# Altium footprint library MidFlg_V2.PcbLib: 28 footprints (part 1 of 2)
Each footprint in its own frame and in the unit in brackets; x right, y up, seen from the top. Pads: shape width x height; smd on the part's side, far side on the other; paste and mask are expansions set on the pad; w line width, h text height; cw(c..) or ccw(c..) is an arc to the next point about the centre after c.
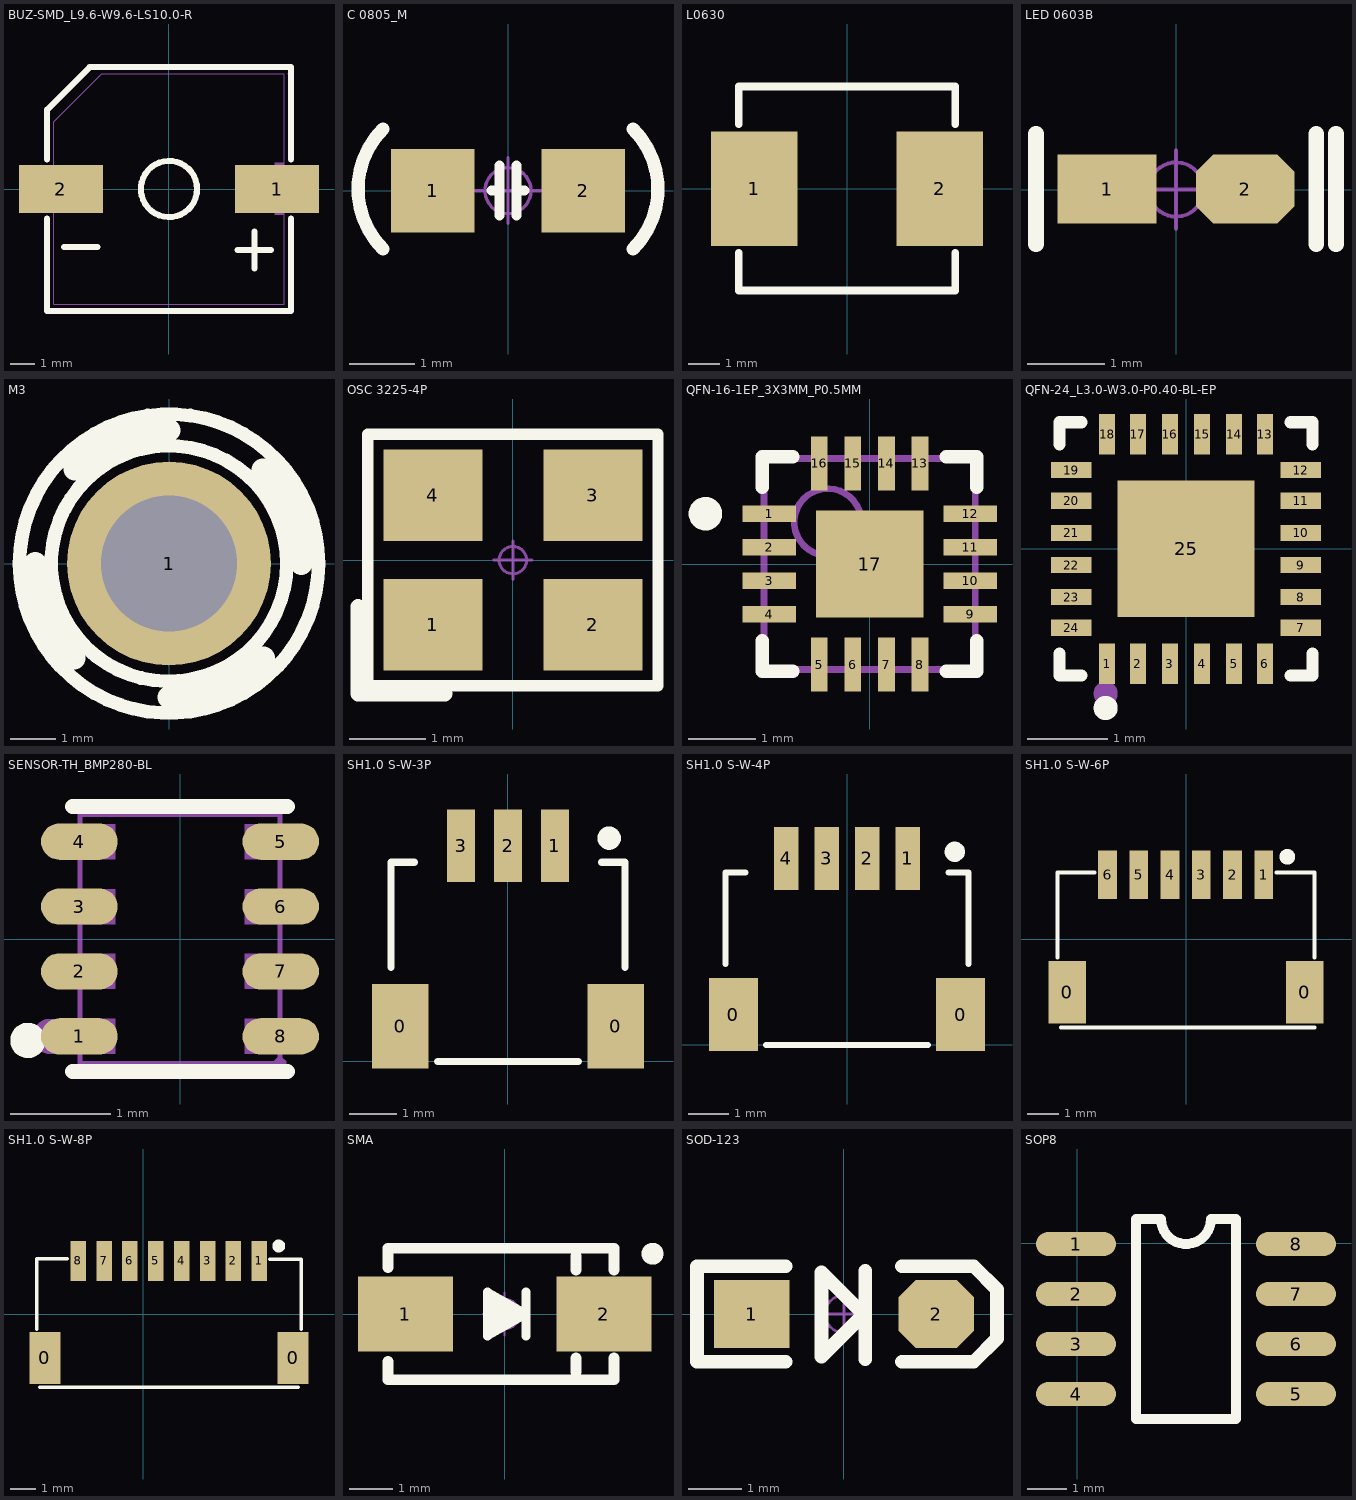
[diagram p0: the footprints below, top view; thin cyan lines are the x and y axes]

## BUZ-SMD_L9.6-W9.6-LS10.0-R [mm]
pads (2):
  rect 3.5x2 smd mask+0.051: 1(4.5,0) 2(-4.5,0)
Top Overlay:
  circle w0.254: c0.001,0 r1.171
  lines w0.254: -5.079,-1.232 -5.079,-5.08 5.081,-5.08 5.081,-1.231 ; -5.079,1.232 -5.079,3.302 -3.301,5.08 5.081,5.08 5.081,1.231 ; -4.381,-2.413 -2.984,-2.413 ; 2.858,-2.54 4.255,-2.54 ; 3.557,-3.302 3.557,-1.778
Mechanical 6:
  region: 3.493,0.191 5.652,0.191 5.652,-0.191 3.493,-0.191
  region: 4.41,-1.07 4.41,1.089 4.791,1.089 4.791,-1.07
  region: -5.508,0.191 -3.349,0.191 -3.349,-0.191 -5.508,-0.191
Mechanical 15:
  region: 5.06,4.8 5.06,4.825 5.025,4.86 4.975,4.86 4.94,4.825 4.94,4.8 4.94,4.775 4.975,4.74 5.025,4.74 5.06,4.775 5.06,4.8
  region: 3.3,0.75 5,0.75 5,-0.75 3.3,-0.75
  region: -3.3,-0.75 -5,-0.75 -5,0.75 -3.3,0.75
  lines w0.051: -4.8,-4.8 4.8,-4.8 4.8,4.8 -2.8,4.8 -4.8,2.8 -4.8,-4.8
3D body "BUZZER1.STEP": height 4.95, standoff 0, extent -5,-4.8 5,4.8

## C 0805_M [mil] "无极性贴片电容                                         淘宝ID:黄晶宝石"
height 19.68
pads (2):
  rect 50x50 smd: 1(-45,0) 2(45,0)
Top Overlay:
  lines w6: -10,0 -5,0 ; -5,-15 -5,15 ; 5,-15 5,15 ; 5,0 10,0
  lines w7.87: -75,-35 cw(c-39,1) -75,37 ; 75,-35 ccw(c39,1) 75,37
Mechanical 15:
  circle w1.97: c0,0 r13.78
  lines w1.97: -19.68,0 19.68,0 ; 0,-19.68 0,19.68
3D body "C 0805.STEP": height 20.08, standoff -0.39, extent -39.37,-24.02 39.37,24.02

## L0630 [mm]
pads (2):
  rect 2.8x3.7 smd: 1(-3,0) 2(3,0)
Top Overlay:
  lines w0.254: -3.5,-2.081 -3.5,-3.3 -3.49,-3.3 3.5,-3.3 3.5,-2.081 ; -3.5,2.081 -3.5,3.3 3.48,3.3 3.5,3.28 ; 3.5,2.081 3.5,3.3
Mechanical 5:
  region: 1.9,1.5 3.5,1.5 3.5,-1.5 1.9,-1.5
  region: -1.9,-1.5 -3.5,-1.5 -3.5,1.5 -1.9,1.5
Mechanical 6:
  circle w0.06: c-3.5,-3.3 r0.03
3D body "User Library-L0630.STEP": height 3.18, standoff 0.03, extent -3.5,-3 3.5,3

## LED 0603B [mil] "蓝色0603LED                             淘宝ID:黄晶宝石"
pads (2):
  rect 50x35 smd: 1(-35,0.26)
  oct 50x35 smd: 2(35,0.26)
Top Overlay:
  lines w8: -71,-27.74 -71,-25.74 -71,28.26 ; 71,-27.74 71,28.26 ; 81,-27.74 81,28.26
Mechanical 15:
  circle w1.97: c0,0 r13.78
  lines w1.97: -19.68,0 19.68,0 ; 0,-19.68 0,19.68
3D body "LED 0603玻璃罩.STEP": height 23.82, standoff 8.07, extent -23.58,-15.79 23.58,15.79
3D body "LED 0603-B.STEP": height 18.36, standoff -0.16, extent -31.49,-15.79 31.5,15.79

## M3 [mm]
pads (1):
  round 4.5 hole 3: 1(0,0)
Top Overlay:
  circle w0.3: c0,0 r3.3
  circle w0.3: c0,0 r2.6
  lines w0.5: -2.952,0 ccw(c0,0) -2.088,-2.088 ; -2.081,2.081 cw(c0,0) 0,2.943 ; 0,-2.95 ccw(c0,0) 2.086,-2.086 ; 2.066,2.066 cw(c0,0) 2.922,0
Bottom Overlay:
  circle w0.3: c0,-0.02 r2.6
  circle w0.3: c0,-0.02 r3.3
  lines w0.5: -2.952,-0.02 ccw(c0,-0.02) -2.088,-2.108 ; -2.081,2.061 cw(c0,-0.02) 0,2.923 ; 0,-2.97 ccw(c0,-0.02) 2.086,-2.106 ; 2.066,2.046 cw(c0,-0.02) 2.922,-0.02

## OSC 3225-4P [mm] "3.2*2.5*0.7mm(长宽高)                         淘宝ID:黄晶宝石"
pads (4):
  rect 1.3x1.2 smd: 1(-1.05,-0.85) 2(1.05,-0.85) 3(1.05,0.85) 4(-1.05,0.85)
Top Overlay:
  lines w0.15: -1.905,-1.651 1.905,-1.651 1.905,1.651 -1.905,1.651 -1.905,-1.651
  lines w0.2: -2.032,-1.753 -0.889,-1.753 ; -2.032,-1.727 -2.032,-0.61
Mechanical 15:
  circle w0.04: c0,0 r0.18
  lines w0.04: -0.254,0 0.254,0 ; 0,-0.254 0,0.254
3D body "OSC 3225-4.STEP": height 0.7, standoff -0.02, extent -1.6,-1.25 1.6,1.25

## QFN-16-1EP_3X3MM_P0.5MM [mm] "QFN, 16-Leads, Body 3.2x3.2mm (max), Pitch 0.50mm, IPC Medium Density"
height 1
pads (17):
  rect 0.8x0.25 smd: 1(-1.5,0.75) 2(-1.5,0.25) 3(-1.5,-0.25) 4(-1.5,-0.75) 9(1.5,-0.75) 10(1.5,-0.25) 11(1.5,0.25) 12(1.5,0.75)
  rect 0.25x0.8 smd: 5(-0.75,-1.5) 6(-0.25,-1.5) 7(0.25,-1.5) 8(0.75,-1.5) 13(0.75,1.5) 14(0.25,1.5) 15(-0.25,1.5) 16(-0.75,1.5)
  rect 1.6x1.6 smd: 17(0,0)
Top Overlay:
  circle w0.25: c-2.45,0.75 r0.125
  lines w0.2: -1.6,-1.143 -1.6,-1.6 -1.143,-1.6 ; -1.6,1.143 -1.6,1.6 -1.143,1.6 ; 1.143,-1.6 1.6,-1.6 1.6,-1.143 ; 1.143,1.6 1.6,1.6 1.6,1.143
Mechanical 13:
  circle w0.1: c-0.625,0.625 r0.5
  lines w0.1: -1.575,-1.575 -1.575,1.575 1.575,1.575 1.575,-1.575 -1.575,-1.575
Mechanical 15:
  lines w0.1: -0.5,0 0.5,0 ; 0,-0.5 0,0.5
3D body "QFN-16-1EP_3x3mm_P0.5mm_EP1.8x1.8mm.step": height 0.77, standoff 0, extent -1.525,-1.499 1.475,1.501

## QFN-24_L3.0-W3.0-P0.40-BL-EP [mm]
pads (25):
  rect 0.2x0.505 smd: 1(-0.981,-1.428) 2(-0.6,-1.428) 3(-0.2,-1.428) 4(0.2,-1.428) 5(0.6,-1.428) 6(0.981,-1.428) 13(0.981,1.428) 14(0.6,1.428) 15(0.2,1.428) 16(-0.2,1.428) 17(-0.6,1.428) 18(-0.981,1.428)
  rect 0.505x0.2 smd: 7(1.428,-0.981) 8(1.428,-0.6) 9(1.428,-0.2) 10(1.428,0.2) 11(1.428,0.6) 12(1.428,0.981) 19(-1.428,0.981) 20(-1.428,0.6) 21(-1.428,0.2) 22(-1.428,-0.2) 23(-1.428,-0.6) 24(-1.428,-0.981)
  rect 1.7x1.7 smd: 25(0,0)
Top Overlay:
  circle w0.15: c-1,-1.98 r0.075
  lines w0.152: -1.576,-1.303 -1.576,-1.576 -1.303,-1.576 ; -1.576,1.303 -1.576,1.576 -1.303,1.576 ; 1.303,-1.576 1.576,-1.576 1.576,-1.303 ; 1.303,1.576 1.576,1.576 1.576,1.303
Mechanical 15:
  circle w0.15: c-1,-1.8 r0.075
3D body "QFN-24_L3.0-W3.0-P0.STEP": height 0.9, standoff 0, extent -1.5,-1.5 1.5,1.5

## SENSOR-TH_BMP280-BL [mm]
pads (8):
  oval 0.767x0.363 smd mask+0.051: 1(-1.008,-0.975) 2(-1.008,-0.325) 3(-1.008,0.325) 4(-1.008,0.975) 5(1.008,0.975) 6(1.008,0.325) 7(1.008,-0.325) 8(1.008,-0.975)
Top Overlay:
  circle w0.175: c-1.524,-1.016 r0.089
  lines w0.152: -1.077,-1.326 1.077,-1.326 ; -1.077,1.326 1.077,1.326
Mechanical 6:
  circle w0.175: c-1.3,-0.975 r0.089
Mechanical 15:
  region: -1.001,-1.151 -0.65,-1.151 -0.65,-0.8 -1.001,-0.8
  region: -1.001,-0.5 -0.65,-0.5 -0.65,-0.15 -1.001,-0.15
  region: -1.001,0.15 -0.65,0.15 -0.65,0.5 -1.001,0.5
  region: -1.001,0.8 -0.65,0.8 -0.65,1.151 -1.001,1.151
  region: 1.001,0.8 0.65,0.8 0.65,1.151 1.001,1.151
  region: 1.001,0.15 0.65,0.15 0.65,0.5 1.001,0.5
  region: 1.001,-0.5 0.65,-0.5 0.65,-0.15 1.001,-0.15
  region: 1.001,-1.151 0.65,-1.151 0.65,-0.8 1.001,-0.8
  region: 1.062,-1.25 1.062,-1.224 1.026,-1.189 0.976,-1.189 0.94,-1.224 0.94,-1.25 0.94,-1.275 0.976,-1.311 1.026,-1.311 1.062,-1.275
  lines w0.051: -1.001,-1.25 -1.001,1.25 1.001,1.25 1.001,-1.25 -1.001,-1.25
3D body "SENSOR-TH_BMP280-BL.STEP": height 0.97, standoff 0, extent -0.999,-1.249 0.999,1.249

## SH1.0 S-W-3P [mm]
pads (5):
  rect 1.2x1.8 smd: 0(-2.292,0.75) 0(2.308,0.75)
  rect 0.6x1.55 smd: 1(1.008,4.6) 2(0.008,4.6) 3(-0.992,4.6)
Top Overlay:
  circle w0.25: c2.167,4.764 r0.125
  lines w0.15: -2.492,2 -2.492,4.25 -1.992,4.25 ; -1.492,0 1.508,0 ; 2.008,4.25 2.508,4.25 2.508,2
3D body "SH1_0_3P.STEP": height 3.15, standoff 0, extent -2.675,-0.076 2.675,4.924

## SH1.0 S-W-4P [mm]
pads (6):
  rect 1.2x1.8 smd: 0(-2.8,0.75) 0(2.8,0.75)
  rect 0.6x1.55 smd: 1(1.5,4.6) 2(0.5,4.6) 3(-0.5,4.6) 4(-1.5,4.6)
Top Overlay:
  circle w0.25: c2.659,4.764 r0.125
  lines w0.15: -3,2 -3,4.25 -2.5,4.25 ; -2,0 2,0 ; 2.5,4.25 3,4.25 3,2
3D body "SH1_0_4P.STEP": height 3.2, standoff 0, extent -3.175,0.017 3.175,5.017

## SH1.0 S-W-6P [mm]
pads (8):
  rect 1.2x2 smd: 0(-3.8,-1.7) 0(3.8,-1.7)
  rect 0.6x1.55 smd: 1(2.489,2.057) 2(1.489,2.057) 3(0.489,2.057) 4(-0.511,2.057) 5(-1.511,2.057) 6(-2.511,2.057)
Top Overlay:
  circle w0.25: c3.243,2.63 r0.125
  lines w0.127: -4.115,-0.584 -4.115,2.134 -2.921,2.134 ; -3.994,-2.831 4.109,-2.831 ; 2.89,2.122 4.115,2.122 4.115,-0.596
3D body "User Library-JST - SM06B-SRSS-TB (SH SERIES - 1_0mm PITCH WIRE-TO-BOARD, SMT, RA).STEP": height 2.9, standoff 0, extent -3.988,-2.475 4.012,2.475

## SH1.0 S-W-8P [mm]
pads (10):
  rect 1.2x2 smd: 0(-3.8,-1.7) 0(5.8,-1.7)
  rect 0.6x1.55 smd: 1(4.489,2.057) 2(3.489,2.057) 3(2.489,2.057) 4(1.489,2.057) 5(0.489,2.057) 6(-0.511,2.057) 7(-1.511,2.057) 8(-2.511,2.057)
Top Overlay:
  circle w0.25: c5.243,2.63 r0.125
  lines w0.127: -4.115,-0.584 -4.115,2.134 -2.921,2.134 ; -3.994,-2.831 6.006,-2.831 ; 4.89,2.122 6.115,2.122 6.115,-0.596
3D body "SH1_0_8P.STEP": height 3.2, standoff 0, extent -4.191,-2.65 6.159,2.35

## SMA [mm] "4.5x2.6*2.2mm（长宽高，不包括引脚）"
height 2.54
pads (2):
  rect 2.2x1.75 smd: 1(-2.3,0) 2(2.3,0)
Top Overlay:
  circle w0.254: c3.429,1.397 r0.127
  lines w0.203: 0.494,-0.508 0.494,0.508 ; -0.395,-0.508 -0.395,0.508 0.494,0 -0.395,-0.508
  lines w0.254: -2.7,-1.105 -2.7,-1.524 2.54,-1.524 2.54,-1.016 ; -2.7,1.08 -2.7,1.524 2.54,1.524 2.54,1.016 ; -0.33,0.305 0.305,0 -0.254,-0.305 -0.254,0.051 0.023,0 ; 1.651,-1.35 1.651,-1.016 ; 1.651,1.016 1.651,1.35
Mechanical 15:
  circle w0.05: c0,0 r0.35
  lines w0.05: -0.5,0 0.5,0 ; 0,-0.5 0,0.5
3D body "SMA.STEP": height 2.15, standoff 0.04, extent -2.528,-1.3 2.575,1.3

## SOD-123 [mil] "2.7x1.6X1.1mm（长宽高，不包括引脚） 淘宝ID:黄晶宝石"
pads (2):
  rect 55x50 smd: 1(-67.5,0)
  oct 55x50 smd: 2(67.5,0)
Top Overlay:
  lines w10: -42.5,-35 -107.5,-35 -107.5,35 -42.5,35 ; 14,-0.8 -16.4,-31.2 -16.4,30.5 15.6,-1.5 ; 15.6,-33.1 15.6,31.7 ; 42.5,-35 95,-35 112,-18 112,18 95,35 42.5,35
Mechanical 15:
  circle w1.97: c0,0 r13.78
  lines w1.97: -19.68,0 19.68,0 ; 0,-19.68 0,19.68
3D body "SOD-123.STEP": height 48.03, standoff 0, extent -72.84,-31.5 72.83,31.5

## SOP8 [mil] "封装库来自淘宝卖家 ID：黄晶宝石"
pads (8):
  oval 80x24 smd: 1(-1,-1) 2(-1,-51) 3(-1,-101) 4(-1,-151) 5(219,-151) 6(219,-101) 7(219,-51) 8(219,-1)
Top Overlay:
  lines w10: 59,-176 159,-176 159,24 134,24 cw(c109,24) 84,24 59,24 59,-176
3D body "SOP8.STEP": height 62.99, standoff 0, extent -3.93,-173.82 233.94,23.82